# Altium footprint library Connector_PinHeader_1.27mm.PcbLib: 278 footprints (part 14 of 18) (continued)
## PinHeader_2x20_P1.27mm_Horizontal [mm] (continued)
F.CrtYd:
  lines w0.05: -1.15,-25.3 -1.15,1.15 7.3,1.15 7.3,-25.3 -1.15,-25.3
F.Fab:
  lines w0.1: 1.77,-24.33 -0.2,-24.33 -0.2,-23.93 1.77,-23.93 ; 1.77,-23.06 -0.2,-23.06 -0.2,-22.66 1.77,-22.66 ; 1.77,-21.79 -0.2,-21.79 -0.2,-21.39 1.77,-21.39 ; 1.77,-20.52 -0.2,-20.52 -0.2,-20.12 1.77,-20.12 ; 1.77,-19.25 -0.2,-19.25 -0.2,-18.85 1.77,-18.85 ; 1.77,-17.98 -0.2,-17.98 -0.2,-17.58 1.77,-17.58 ; 1.77,-16.71 -0.2,-16.71 -0.2,-16.31 1.77,-16.31 ; 1.77,-15.44 -0.2,-15.44 -0.2,-15.04 1.77,-15.04 ; 1.77,-14.17 -0.2,-14.17 -0.2,-13.77 1.77,-13.77 ; 1.77,-12.9 -0.2,-12.9 -0.2,-12.5 1.77,-12.5 ; 1.77,-11.63 -0.2,-11.63 -0.2,-11.23 1.77,-11.23 ; 1.77,-10.36 -0.2,-10.36 -0.2,-9.96 1.77,-9.96 ; 1.77,-9.09 -0.2,-9.09 -0.2,-8.69 1.77,-8.69 ; 1.77,-7.82 -0.2,-7.82 -0.2,-7.42 1.77,-7.42 ; 1.77,-6.55 -0.2,-6.55 -0.2,-6.15 1.77,-6.15 ; 1.77,-5.28 -0.2,-5.28 -0.2,-4.88 1.77,-4.88 ; 1.77,-4.01 -0.2,-4.01 -0.2,-3.61 1.77,-3.61 ; 1.77,-2.74 -0.2,-2.74 -0.2,-2.34 1.77,-2.34 ; 1.77,-1.47 -0.2,-1.47 -0.2,-1.07 1.77,-1.07 ; 1.77,-0.2 -0.2,-0.2 -0.2,0.2 1.77,0.2 ; 2.77,-24.33 6.77,-24.33 6.77,-23.93 2.77,-23.93 ; 2.77,-23.06 6.77,-23.06 6.77,-22.66 2.77,-22.66 ; 2.77,-21.79 6.77,-21.79 6.77,-21.39 2.77,-21.39 ; 2.77,-20.52 6.77,-20.52 6.77,-20.12 2.77,-20.12 ; 2.77,-19.25 6.77,-19.25 6.77,-18.85 2.77,-18.85 ; 2.77,-17.98 6.77,-17.98 6.77,-17.58 2.77,-17.58 ; 2.77,-16.71 6.77,-16.71 6.77,-16.31 2.77,-16.31 ; 2.77,-15.44 6.77,-15.44 6.77,-15.04 2.77,-15.04 ; 2.77,-14.17 6.77,-14.17 6.77,-13.77 2.77,-13.77 ; 2.77,-12.9 6.77,-12.9 6.77,-12.5 2.77,-12.5 ; 2.77,-11.63 6.77,-11.63 6.77,-11.23 2.77,-11.23 ; 2.77,-10.36 6.77,-10.36 6.77,-9.96 2.77,-9.96 ; 2.77,-9.09 6.77,-9.09 6.77,-8.69 2.77,-8.69 ; 2.77,-7.82 6.77,-7.82 6.77,-7.42 2.77,-7.42 ; 2.77,-6.55 6.77,-6.55 6.77,-6.15 2.77,-6.15 ; 2.77,-5.28 6.77,-5.28 6.77,-4.88 2.77,-4.88 ; 2.77,-4.01 6.77,-4.01 6.77,-3.61 2.77,-3.61 ; 2.77,-2.74 6.77,-2.74 6.77,-2.34 2.77,-2.34 ; 2.77,-1.47 6.77,-1.47 6.77,-1.07 2.77,-1.07 ; 2.77,-0.2 6.77,-0.2 6.77,0.2 2.77,0.2 ; 1.77,-24.765 2.77,-24.765 2.77,0.635 2.02,0.635 1.77,0.385 1.77,-24.765
  text "'.Designator'" at 2.774,-14.493 h0.6

## PinHeader_2x20_P1.27mm_Vertical [mm]
pads (40):
  rect 1x1 hole 0.65: 1(0,0)
  rrect100% 1x1 hole 0.65: 2(1.27,0) 3(0,-1.27) 4(1.27,-1.27) 5(0,-2.54) 6(1.27,-2.54) 7(0,-3.81) 8(1.27,-3.81) 9(0,-5.08) 10(1.27,-5.08) 11(0,-6.35) 12(1.27,-6.35) 13(0,-7.62) 14(1.27,-7.62) 15(0,-8.89) 16(1.27,-8.89) 17(0,-10.16) 18(1.27,-10.16) 19(0,-11.43) 20(1.27,-11.43) 21(0,-12.7) 22(1.27,-12.7) 23(0,-13.97) 24(1.27,-13.97) 25(0,-15.24) 26(1.27,-15.24) 27(0,-16.51) 28(1.27,-16.51) 29(0,-17.78) 30(1.27,-17.78) 31(0,-19.05) 32(1.27,-19.05) 33(0,-20.32) 34(1.27,-20.32) 35(0,-21.59) 36(1.27,-21.59) 37(0,-22.86) 38(1.27,-22.86) 39(0,-24.13) 40(1.27,-24.13)
F.SilkS:
  lines w0.12: -1.13,0 -1.13,0.76 0,0.76 ; -0.563,-0.76 -1.13,-0.76 -1.13,-24.825 -0.308,-24.825 ; 0.308,-24.825 0.962,-24.825 ; 0.563,-0.76 0.707,-0.76 ; 0.76,-0.707 0.76,-0.563 ; 0.76,0.563 0.76,0.695 0.962,0.695 ; 1.578,-24.825 2.4,-24.825 2.4,0.695 1.578,0.695
F.CrtYd:
  lines w0.05: -1.6,-25.3 2.85,-25.3 2.85,1.15 -1.6,1.15 -1.6,-25.3
F.Fab:
  lines w0.1: -1.07,-24.765 -1.07,-0.218 -0.218,0.635 2.34,0.635 2.34,-24.765 -1.07,-24.765
  text "'.Designator'" at 1.475,-16.112 h1

## PinHeader_2x20_P1.27mm_Vertical_SMD [mm]
pads (40):
  rect 2.4x0.74 smd: 1(-1.95,12.065) 2(1.95,12.065) 3(-1.95,10.795) 4(1.95,10.795) 5(-1.95,9.525) 6(1.95,9.525) 7(-1.95,8.255) 8(1.95,8.255) 9(-1.95,6.985) 10(1.95,6.985) 11(-1.95,5.715) 12(1.95,5.715) 13(-1.95,4.445) 14(1.95,4.445) 15(-1.95,3.175) 16(1.95,3.175) 17(-1.95,1.905) 18(1.95,1.905) 19(-1.95,0.635) 20(1.95,0.635) 21(-1.95,-0.635) 22(1.95,-0.635) 23(-1.95,-1.905) 24(1.95,-1.905) 25(-1.95,-3.175) 26(1.95,-3.175) 27(-1.95,-4.445) 28(1.95,-4.445) 29(-1.95,-5.715) 30(1.95,-5.715) 31(-1.95,-6.985) 32(1.95,-6.985) 33(-1.95,-8.255) 34(1.95,-8.255) 35(-1.95,-9.525) 36(1.95,-9.525) 37(-1.95,-10.795) 38(1.95,-10.795) 39(-1.95,-12.065) 40(1.95,-12.065)
F.SilkS:
  lines w0.12: -3.09,12.695 -1.765,12.695 -1.765,12.76 1.765,12.76 1.765,12.695 ; -1.765,-12.695 -1.765,-12.76 1.765,-12.76 1.765,-12.695
F.CrtYd:
  lines w0.05: -4.3,-13.2 -4.3,13.2 4.3,13.2 4.3,-13.2 -4.3,-13.2
F.Fab:
  lines w0.1: -1.705,-12.265 -2.75,-12.265 -2.75,-11.865 -1.705,-11.865 ; -1.705,-10.995 -2.75,-10.995 -2.75,-10.595 -1.705,-10.595 ; -1.705,-9.725 -2.75,-9.725 -2.75,-9.325 -1.705,-9.325 ; -1.705,-8.455 -2.75,-8.455 -2.75,-8.055 -1.705,-8.055 ; -1.705,-7.185 -2.75,-7.185 -2.75,-6.785 -1.705,-6.785 ; -1.705,-5.915 -2.75,-5.915 -2.75,-5.515 -1.705,-5.515 ; -1.705,-4.645 -2.75,-4.645 -2.75,-4.245 -1.705,-4.245 ; -1.705,-3.375 -2.75,-3.375 -2.75,-2.975 -1.705,-2.975 ; -1.705,-2.105 -2.75,-2.105 -2.75,-1.705 -1.705,-1.705 ; -1.705,-0.835 -2.75,-0.835 -2.75,-0.435 -1.705,-0.435 ; -1.705,0.435 -2.75,0.435 -2.75,0.835 -1.705,0.835 ; -1.705,1.705 -2.75,1.705 -2.75,2.105 -1.705,2.105 ; -1.705,2.975 -2.75,2.975 -2.75,3.375 -1.705,3.375 ; -1.705,4.245 -2.75,4.245 -2.75,4.645 -1.705,4.645 ; -1.705,5.515 -2.75,5.515 -2.75,5.915 -1.705,5.915 ; -1.705,6.785 -2.75,6.785 -2.75,7.185 -1.705,7.185 ; -1.705,8.055 -2.75,8.055 -2.75,8.455 -1.705,8.455 ; -1.705,9.325 -2.75,9.325 -2.75,9.725 -1.705,9.725 ; -1.705,10.595 -2.75,10.595 -2.75,10.995 -1.705,10.995 ; -1.705,11.865 -2.75,11.865 -2.75,12.265 -1.705,12.265 ; 1.705,-12.265 2.75,-12.265 2.75,-11.865 1.705,-11.865 ; 1.705,-10.995 2.75,-10.995 2.75,-10.595 1.705,-10.595 ; 1.705,-9.725 2.75,-9.725 2.75,-9.325 1.705,-9.325 ; 1.705,-8.455 2.75,-8.455 2.75,-8.055 1.705,-8.055 ; 1.705,-7.185 2.75,-7.185 2.75,-6.785 1.705,-6.785 ; 1.705,-5.915 2.75,-5.915 2.75,-5.515 1.705,-5.515 ; 1.705,-4.645 2.75,-4.645 2.75,-4.245 1.705,-4.245 ; 1.705,-3.375 2.75,-3.375 2.75,-2.975 1.705,-2.975 ; 1.705,-2.105 2.75,-2.105 2.75,-1.705 1.705,-1.705 ; 1.705,-0.835 2.75,-0.835 2.75,-0.435 1.705,-0.435 ; 1.705,0.435 2.75,0.435 2.75,0.835 1.705,0.835 ; 1.705,1.705 2.75,1.705 2.75,2.105 1.705,2.105 ; 1.705,2.975 2.75,2.975 2.75,3.375 1.705,3.375 ; 1.705,4.245 2.75,4.245 2.75,4.645 1.705,4.645 ; 1.705,5.515 2.75,5.515 2.75,5.915 1.705,5.915 ; 1.705,6.785 2.75,6.785 2.75,7.185 1.705,7.185 ; 1.705,8.055 2.75,8.055 2.75,8.455 1.705,8.455 ; 1.705,9.325 2.75,9.325 2.75,9.725 1.705,9.725 ; 1.705,10.595 2.75,10.595 2.75,10.995 1.705,10.995 ; 1.705,11.865 2.75,11.865 2.75,12.265 1.705,12.265 ; -1.705,12.265 -1.27,12.7 1.705,12.7 1.705,-12.7 -1.705,-12.7 -1.705,12.265
  text "'.Designator'" at 0.84,-4.047 h1

## PinHeader_2x21_P1.27mm_Horizontal [mm]
pads (42):
  rect 1x1 hole 0.65: 1(0,0)
  rrect100% 1x1 hole 0.65: 2(1.27,0) 3(0,-1.27) 4(1.27,-1.27) 5(0,-2.54) 6(1.27,-2.54) 7(0,-3.81) 8(1.27,-3.81) 9(0,-5.08) 10(1.27,-5.08) 11(0,-6.35) 12(1.27,-6.35) 13(0,-7.62) 14(1.27,-7.62) 15(0,-8.89) 16(1.27,-8.89) 17(0,-10.16) 18(1.27,-10.16) 19(0,-11.43) 20(1.27,-11.43) 21(0,-12.7) 22(1.27,-12.7) 23(0,-13.97) 24(1.27,-13.97) 25(0,-15.24) 26(1.27,-15.24) 27(0,-16.51) 28(1.27,-16.51) 29(0,-17.78) 30(1.27,-17.78) 31(0,-19.05) 32(1.27,-19.05) 33(0,-20.32) 34(1.27,-20.32) 35(0,-21.59) 36(1.27,-21.59) 37(0,-22.86) 38(1.27,-22.86) 39(0,-24.13) 40(1.27,-24.13) 41(0,-25.4) 42(1.27,-25.4)
F.SilkS:
  lines w0.12: -0.76,0 -0.76,0.76 0,0.76 ; 1.71,-26.02 1.71,-26.095 2.83,-26.095 2.83,0.695 1.71,0.695 1.71,0.62 ; 1.71,-24.78 1.71,-24.75 ; 1.71,-24.765 2.83,-24.765 ; 1.71,-23.51 1.71,-23.48 ; 1.71,-23.495 2.83,-23.495 ; 1.71,-22.24 1.71,-22.21 ; 1.71,-22.225 2.83,-22.225 ; 1.71,-20.97 1.71,-20.94 ; 1.71,-20.955 2.83,-20.955 ; 1.71,-19.7 1.71,-19.67 ; 1.71,-19.685 2.83,-19.685 ; 1.71,-18.43 1.71,-18.4 ; 1.71,-18.415 2.83,-18.415 ; 1.71,-17.16 1.71,-17.13 ; 1.71,-17.145 2.83,-17.145 ; 1.71,-15.89 1.71,-15.86 ; 1.71,-15.875 2.83,-15.875 ; 1.71,-14.62 1.71,-14.59 ; 1.71,-14.605 2.83,-14.605 ; 1.71,-13.35 1.71,-13.32 ; 1.71,-13.335 2.83,-13.335 ; 1.71,-12.08 1.71,-12.05 ; 1.71,-12.065 2.83,-12.065 ; 1.71,-10.81 1.71,-10.78 ; 1.71,-10.795 2.83,-10.795 ; 1.71,-9.54 1.71,-9.51 ; 1.71,-9.525 2.83,-9.525 ; 1.71,-8.27 1.71,-8.24 ; 1.71,-8.255 2.83,-8.255 ; 1.71,-7 1.71,-6.97 ; 1.71,-6.985 2.83,-6.985 ; 1.71,-5.73 1.71,-5.7 ; 1.71,-5.715 2.83,-5.715 ; 1.71,-4.46 1.71,-4.43 ; 1.71,-4.445 2.83,-4.445 ; 1.71,-3.19 1.71,-3.16 ; 1.71,-3.175 2.83,-3.175 ; 1.71,-1.92 1.71,-1.89 ; 1.71,-1.905 2.83,-1.905 ; 1.71,-0.65 1.71,-0.62 ; 1.71,-0.635 2.83,-0.635 ; 2.83,-25.66 6.83,-25.66 6.83,-25.14 2.83,-25.14 ; 2.83,-24.39 6.83,-24.39 6.83,-23.87 2.83,-23.87 ; 2.83,-23.12 6.83,-23.12 6.83,-22.6 2.83,-22.6 ; 2.83,-21.85 6.83,-21.85 6.83,-21.33 2.83,-21.33 ; 2.83,-20.58 6.83,-20.58 6.83,-20.06 2.83,-20.06 ; 2.83,-19.31 6.83,-19.31 6.83,-18.79 2.83,-18.79 ; 2.83,-18.04 6.83,-18.04 6.83,-17.52 2.83,-17.52 ; 2.83,-16.77 6.83,-16.77 6.83,-16.25 2.83,-16.25 ; 2.83,-15.5 6.83,-15.5 6.83,-14.98 2.83,-14.98 ; 2.83,-14.23 6.83,-14.23 6.83,-13.71 2.83,-13.71 ; 2.83,-12.96 6.83,-12.96 6.83,-12.44 2.83,-12.44 ; 2.83,-11.69 6.83,-11.69 6.83,-11.17 2.83,-11.17 ; 2.83,-10.42 6.83,-10.42 6.83,-9.9 2.83,-9.9 ; 2.83,-9.15 6.83,-9.15 6.83,-8.63 2.83,-8.63 ; 2.83,-7.88 6.83,-7.88 6.83,-7.36 2.83,-7.36 ; 2.83,-6.61 6.83,-6.61 6.83,-6.09 2.83,-6.09 ; 2.83,-5.34 6.83,-5.34 6.83,-4.82 2.83,-4.82 ; 2.83,-4.07 6.83,-4.07 6.83,-3.55 2.83,-3.55 ; 2.83,-2.8 6.83,-2.8 6.83,-2.28 2.83,-2.28 ; 2.83,-1.53 6.83,-1.53 6.83,-1.01 2.83,-1.01 ; 2.83,-0.26 6.83,-0.26 6.83,0.26 2.83,0.26 ; 2.83,-0.16 6.83,-0.16 ; 2.83,-0.04 6.83,-0.04 ; 2.83,0.08 6.83,0.08 ; 2.83,0.2 6.83,0.2
F.CrtYd:
  lines w0.05: -1.15,-26.55 7.3,-26.55 7.3,1.15 -1.15,1.15 -1.15,-26.55
F.Fab:
  lines w0.1: 1.77,-25.6 -0.2,-25.6 -0.2,-25.2 1.77,-25.2 ; 1.77,-24.33 -0.2,-24.33 -0.2,-23.93 1.77,-23.93 ; 1.77,-23.06 -0.2,-23.06 -0.2,-22.66 1.77,-22.66 ; 1.77,-21.79 -0.2,-21.79 -0.2,-21.39 1.77,-21.39 ; 1.77,-20.52 -0.2,-20.52 -0.2,-20.12 1.77,-20.12 ; 1.77,-19.25 -0.2,-19.25 -0.2,-18.85 1.77,-18.85 ; 1.77,-17.98 -0.2,-17.98 -0.2,-17.58 1.77,-17.58 ; 1.77,-16.71 -0.2,-16.71 -0.2,-16.31 1.77,-16.31 ; 1.77,-15.44 -0.2,-15.44 -0.2,-15.04 1.77,-15.04 ; 1.77,-14.17 -0.2,-14.17 -0.2,-13.77 1.77,-13.77 ; 1.77,-12.9 -0.2,-12.9 -0.2,-12.5 1.77,-12.5 ; 1.77,-11.63 -0.2,-11.63 -0.2,-11.23 1.77,-11.23 ; 1.77,-10.36 -0.2,-10.36 -0.2,-9.96 1.77,-9.96 ; 1.77,-9.09 -0.2,-9.09 -0.2,-8.69 1.77,-8.69 ; 1.77,-7.82 -0.2,-7.82 -0.2,-7.42 1.77,-7.42 ; 1.77,-6.55 -0.2,-6.55 -0.2,-6.15 1.77,-6.15 ; 1.77,-5.28 -0.2,-5.28 -0.2,-4.88 1.77,-4.88 ; 1.77,-4.01 -0.2,-4.01 -0.2,-3.61 1.77,-3.61 ; 1.77,-2.74 -0.2,-2.74 -0.2,-2.34 1.77,-2.34 ; 1.77,-1.47 -0.2,-1.47 -0.2,-1.07 1.77,-1.07 ; 1.77,-0.2 -0.2,-0.2 -0.2,0.2 1.77,0.2 ; 2.77,-25.6 6.77,-25.6 6.77,-25.2 2.77,-25.2 ; 2.77,-24.33 6.77,-24.33 6.77,-23.93 2.77,-23.93 ; 2.77,-23.06 6.77,-23.06 6.77,-22.66 2.77,-22.66 ; 2.77,-21.79 6.77,-21.79 6.77,-21.39 2.77,-21.39 ; 2.77,-20.52 6.77,-20.52 6.77,-20.12 2.77,-20.12 ; 2.77,-19.25 6.77,-19.25 6.77,-18.85 2.77,-18.85 ; 2.77,-17.98 6.77,-17.98 6.77,-17.58 2.77,-17.58 ; 2.77,-16.71 6.77,-16.71 6.77,-16.31 2.77,-16.31 ; 2.77,-15.44 6.77,-15.44 6.77,-15.04 2.77,-15.04 ; 2.77,-14.17 6.77,-14.17 6.77,-13.77 2.77,-13.77 ; 2.77,-12.9 6.77,-12.9 6.77,-12.5 2.77,-12.5 ; 2.77,-11.63 6.77,-11.63 6.77,-11.23 2.77,-11.23 ; 2.77,-10.36 6.77,-10.36 6.77,-9.96 2.77,-9.96 ; 2.77,-9.09 6.77,-9.09 6.77,-8.69 2.77,-8.69 ; 2.77,-7.82 6.77,-7.82 6.77,-7.42 2.77,-7.42 ; 2.77,-6.55 6.77,-6.55 6.77,-6.15 2.77,-6.15 ; 2.77,-5.28 6.77,-5.28 6.77,-4.88 2.77,-4.88 ; 2.77,-4.01 6.77,-4.01 6.77,-3.61 2.77,-3.61 ; 2.77,-2.74 6.77,-2.74 6.77,-2.34 2.77,-2.34 ; 2.77,-1.47 6.77,-1.47 6.77,-1.07 2.77,-1.07 ; 2.77,-0.2 6.77,-0.2 6.77,0.2 2.77,0.2 ; 1.77,-26.035 2.77,-26.035 2.77,0.635 2.02,0.635 1.77,0.385 1.77,-26.035
  text "'.Designator'" at 2.774,-15.128 h0.6

## PinHeader_2x21_P1.27mm_Vertical [mm]
pads (42):
  rect 1x1 hole 0.65: 1(0,0)
  rrect100% 1x1 hole 0.65: 2(1.27,0) 3(0,-1.27) 4(1.27,-1.27) 5(0,-2.54) 6(1.27,-2.54) 7(0,-3.81) 8(1.27,-3.81) 9(0,-5.08) 10(1.27,-5.08) 11(0,-6.35) 12(1.27,-6.35) 13(0,-7.62) 14(1.27,-7.62) 15(0,-8.89) 16(1.27,-8.89) 17(0,-10.16) 18(1.27,-10.16) 19(0,-11.43) 20(1.27,-11.43) 21(0,-12.7) 22(1.27,-12.7) 23(0,-13.97) 24(1.27,-13.97) 25(0,-15.24) 26(1.27,-15.24) 27(0,-16.51) 28(1.27,-16.51) 29(0,-17.78) 30(1.27,-17.78) 31(0,-19.05) 32(1.27,-19.05) 33(0,-20.32) 34(1.27,-20.32) 35(0,-21.59) 36(1.27,-21.59) 37(0,-22.86) 38(1.27,-22.86) 39(0,-24.13) 40(1.27,-24.13) 41(0,-25.4) 42(1.27,-25.4)
F.SilkS:
  lines w0.12: -1.13,0 -1.13,0.76 0,0.76 ; -0.563,-0.76 -1.13,-0.76 -1.13,-26.095 -0.308,-26.095 ; 0.308,-26.095 0.962,-26.095 ; 0.563,-0.76 0.707,-0.76 ; 0.76,-0.707 0.76,-0.563 ; 0.76,0.563 0.76,0.695 0.962,0.695 ; 1.578,-26.095 2.4,-26.095 2.4,0.695 1.578,0.695
F.CrtYd:
  lines w0.05: -1.6,-26.55 -1.6,1.15 2.85,1.15 2.85,-26.55 -1.6,-26.55
F.Fab:
  lines w0.1: -1.07,-26.035 2.34,-26.035 2.34,0.635 -0.218,0.635 -1.07,-0.218 -1.07,-26.035
  text "'.Designator'" at 1.475,-16.747 h1

## PinHeader_2x21_P1.27mm_Vertical_SMD [mm]
pads (42):
  rect 2.4x0.74 smd: 1(-1.95,12.7) 2(1.95,12.7) 3(-1.95,11.43) 4(1.95,11.43) 5(-1.95,10.16) 6(1.95,10.16) 7(-1.95,8.89) 8(1.95,8.89) 9(-1.95,7.62) 10(1.95,7.62) 11(-1.95,6.35) 12(1.95,6.35) 13(-1.95,5.08) 14(1.95,5.08) 15(-1.95,3.81) 16(1.95,3.81) 17(-1.95,2.54) 18(1.95,2.54) 19(-1.95,1.27) 20(1.95,1.27) 21(-1.95,0) 22(1.95,0) 23(-1.95,-1.27) 24(1.95,-1.27) 25(-1.95,-2.54) 26(1.95,-2.54) 27(-1.95,-3.81) 28(1.95,-3.81) 29(-1.95,-5.08) 30(1.95,-5.08) 31(-1.95,-6.35) 32(1.95,-6.35) 33(-1.95,-7.62) 34(1.95,-7.62) 35(-1.95,-8.89) 36(1.95,-8.89) 37(-1.95,-10.16) 38(1.95,-10.16) 39(-1.95,-11.43) 40(1.95,-11.43) 41(-1.95,-12.7) 42(1.95,-12.7)
F.SilkS:
  lines w0.12: -3.09,13.33 -1.765,13.33 -1.765,13.395 1.765,13.395 1.765,13.33 ; -1.765,-13.33 -1.765,-13.395 1.765,-13.395 1.765,-13.33
F.CrtYd:
  lines w0.05: -4.3,-13.85 -4.3,13.85 4.3,13.85 4.3,-13.85 -4.3,-13.85
F.Fab:
  lines w0.1: -1.705,-12.9 -2.75,-12.9 -2.75,-12.5 -1.705,-12.5 ; -1.705,-11.63 -2.75,-11.63 -2.75,-11.23 -1.705,-11.23 ; -1.705,-10.36 -2.75,-10.36 -2.75,-9.96 -1.705,-9.96 ; -1.705,-9.09 -2.75,-9.09 -2.75,-8.69 -1.705,-8.69 ; -1.705,-7.82 -2.75,-7.82 -2.75,-7.42 -1.705,-7.42 ; -1.705,-6.55 -2.75,-6.55 -2.75,-6.15 -1.705,-6.15 ; -1.705,-5.28 -2.75,-5.28 -2.75,-4.88 -1.705,-4.88 ; -1.705,-4.01 -2.75,-4.01 -2.75,-3.61 -1.705,-3.61 ; -1.705,-2.74 -2.75,-2.74 -2.75,-2.34 -1.705,-2.34 ; -1.705,-1.47 -2.75,-1.47 -2.75,-1.07 -1.705,-1.07 ; -1.705,-0.2 -2.75,-0.2 -2.75,0.2 -1.705,0.2 ; -1.705,1.07 -2.75,1.07 -2.75,1.47 -1.705,1.47 ; -1.705,2.34 -2.75,2.34 -2.75,2.74 -1.705,2.74 ; -1.705,3.61 -2.75,3.61 -2.75,4.01 -1.705,4.01 ; -1.705,4.88 -2.75,4.88 -2.75,5.28 -1.705,5.28 ; -1.705,6.15 -2.75,6.15 -2.75,6.55 -1.705,6.55 ; -1.705,7.42 -2.75,7.42 -2.75,7.82 -1.705,7.82 ; -1.705,8.69 -2.75,8.69 -2.75,9.09 -1.705,9.09 ; -1.705,9.96 -2.75,9.96 -2.75,10.36 -1.705,10.36 ; -1.705,11.23 -2.75,11.23 -2.75,11.63 -1.705,11.63 ; -1.705,12.5 -2.75,12.5 -2.75,12.9 -1.705,12.9 ; 1.705,-12.9 2.75,-12.9 2.75,-12.5 1.705,-12.5 ; 1.705,-11.63 2.75,-11.63 2.75,-11.23 1.705,-11.23 ; 1.705,-10.36 2.75,-10.36 2.75,-9.96 1.705,-9.96 ; 1.705,-9.09 2.75,-9.09 2.75,-8.69 1.705,-8.69 ; 1.705,-7.82 2.75,-7.82 2.75,-7.42 1.705,-7.42 ; 1.705,-6.55 2.75,-6.55 2.75,-6.15 1.705,-6.15 ; 1.705,-5.28 2.75,-5.28 2.75,-4.88 1.705,-4.88 ; 1.705,-4.01 2.75,-4.01 2.75,-3.61 1.705,-3.61 ; 1.705,-2.74 2.75,-2.74 2.75,-2.34 1.705,-2.34 ; 1.705,-1.47 2.75,-1.47 2.75,-1.07 1.705,-1.07 ; 1.705,-0.2 2.75,-0.2 2.75,0.2 1.705,0.2 ; 1.705,1.07 2.75,1.07 2.75,1.47 1.705,1.47 ; 1.705,2.34 2.75,2.34 2.75,2.74 1.705,2.74 ; 1.705,3.61 2.75,3.61 2.75,4.01 1.705,4.01 ; 1.705,4.88 2.75,4.88 2.75,5.28 1.705,5.28 ; 1.705,6.15 2.75,6.15 2.75,6.55 1.705,6.55 ; 1.705,7.42 2.75,7.42 2.75,7.82 1.705,7.82 ; 1.705,8.69 2.75,8.69 2.75,9.09 1.705,9.09 ; 1.705,9.96 2.75,9.96 2.75,10.36 1.705,10.36 ; 1.705,11.23 2.75,11.23 2.75,11.63 1.705,11.63 ; 1.705,12.5 2.75,12.5 2.75,12.9 1.705,12.9 ; -1.705,12.9 -1.27,13.335 1.705,13.335 1.705,-13.335 -1.705,-13.335 -1.705,12.9
  text "'.Designator'" at 0.84,-4.047 h1

## PinHeader_2x22_P1.27mm_Horizontal [mm]
pads (44):
  rect 1x1 hole 0.65: 1(0,0)
  rrect100% 1x1 hole 0.65: 2(1.27,0) 3(0,-1.27) 4(1.27,-1.27) 5(0,-2.54) 6(1.27,-2.54) 7(0,-3.81) 8(1.27,-3.81) 9(0,-5.08) 10(1.27,-5.08) 11(0,-6.35) 12(1.27,-6.35) 13(0,-7.62) 14(1.27,-7.62) 15(0,-8.89) 16(1.27,-8.89) 17(0,-10.16) 18(1.27,-10.16) 19(0,-11.43) 20(1.27,-11.43) 21(0,-12.7) 22(1.27,-12.7) 23(0,-13.97) 24(1.27,-13.97) 25(0,-15.24) 26(1.27,-15.24) 27(0,-16.51) 28(1.27,-16.51) 29(0,-17.78) 30(1.27,-17.78) 31(0,-19.05) 32(1.27,-19.05) 33(0,-20.32) 34(1.27,-20.32) 35(0,-21.59) 36(1.27,-21.59) 37(0,-22.86) 38(1.27,-22.86) 39(0,-24.13) 40(1.27,-24.13) 41(0,-25.4) 42(1.27,-25.4) 43(0,-26.67) 44(1.27,-26.67)
F.SilkS:
  lines w0.12: -0.76,0 -0.76,0.76 0,0.76 ; 1.71,-27.29 1.71,-27.365 2.83,-27.365 2.83,0.695 1.71,0.695 1.71,0.62 ; 1.71,-26.05 1.71,-26.02 ; 1.71,-26.035 2.83,-26.035 ; 1.71,-24.78 1.71,-24.75 ; 1.71,-24.765 2.83,-24.765 ; 1.71,-23.51 1.71,-23.48 ; 1.71,-23.495 2.83,-23.495 ; 1.71,-22.24 1.71,-22.21 ; 1.71,-22.225 2.83,-22.225 ; 1.71,-20.97 1.71,-20.94 ; 1.71,-20.955 2.83,-20.955 ; 1.71,-19.7 1.71,-19.67 ; 1.71,-19.685 2.83,-19.685 ; 1.71,-18.43 1.71,-18.4 ; 1.71,-18.415 2.83,-18.415 ; 1.71,-17.16 1.71,-17.13 ; 1.71,-17.145 2.83,-17.145 ; 1.71,-15.89 1.71,-15.86 ; 1.71,-15.875 2.83,-15.875 ; 1.71,-14.62 1.71,-14.59 ; 1.71,-14.605 2.83,-14.605 ; 1.71,-13.35 1.71,-13.32 ; 1.71,-13.335 2.83,-13.335 ; 1.71,-12.08 1.71,-12.05 ; 1.71,-12.065 2.83,-12.065 ; 1.71,-10.81 1.71,-10.78 ; 1.71,-10.795 2.83,-10.795 ; 1.71,-9.54 1.71,-9.51 ; 1.71,-9.525 2.83,-9.525 ; 1.71,-8.27 1.71,-8.24 ; 1.71,-8.255 2.83,-8.255 ; 1.71,-7 1.71,-6.97 ; 1.71,-6.985 2.83,-6.985 ; 1.71,-5.73 1.71,-5.7 ; 1.71,-5.715 2.83,-5.715 ; 1.71,-4.46 1.71,-4.43 ; 1.71,-4.445 2.83,-4.445 ; 1.71,-3.19 1.71,-3.16 ; 1.71,-3.175 2.83,-3.175 ; 1.71,-1.92 1.71,-1.89 ; 1.71,-1.905 2.83,-1.905 ; 1.71,-0.65 1.71,-0.62 ; 1.71,-0.635 2.83,-0.635 ; 2.83,-26.93 6.83,-26.93 6.83,-26.41 2.83,-26.41 ; 2.83,-25.66 6.83,-25.66 6.83,-25.14 2.83,-25.14 ; 2.83,-24.39 6.83,-24.39 6.83,-23.87 2.83,-23.87 ; 2.83,-23.12 6.83,-23.12 6.83,-22.6 2.83,-22.6 ; 2.83,-21.85 6.83,-21.85 6.83,-21.33 2.83,-21.33 ; 2.83,-20.58 6.83,-20.58 6.83,-20.06 2.83,-20.06 ; 2.83,-19.31 6.83,-19.31 6.83,-18.79 2.83,-18.79 ; 2.83,-18.04 6.83,-18.04 6.83,-17.52 2.83,-17.52 ; 2.83,-16.77 6.83,-16.77 6.83,-16.25 2.83,-16.25 ; 2.83,-15.5 6.83,-15.5 6.83,-14.98 2.83,-14.98 ; 2.83,-14.23 6.83,-14.23 6.83,-13.71 2.83,-13.71 ; 2.83,-12.96 6.83,-12.96 6.83,-12.44 2.83,-12.44 ; 2.83,-11.69 6.83,-11.69 6.83,-11.17 2.83,-11.17 ; 2.83,-10.42 6.83,-10.42 6.83,-9.9 2.83,-9.9 ; 2.83,-9.15 6.83,-9.15 6.83,-8.63 2.83,-8.63 ; 2.83,-7.88 6.83,-7.88 6.83,-7.36 2.83,-7.36 ; 2.83,-6.61 6.83,-6.61 6.83,-6.09 2.83,-6.09 ; 2.83,-5.34 6.83,-5.34 6.83,-4.82 2.83,-4.82 ; 2.83,-4.07 6.83,-4.07 6.83,-3.55 2.83,-3.55 ; 2.83,-2.8 6.83,-2.8 6.83,-2.28 2.83,-2.28 ; 2.83,-1.53 6.83,-1.53 6.83,-1.01 2.83,-1.01 ; 2.83,-0.26 6.83,-0.26 6.83,0.26 2.83,0.26 ; 2.83,-0.16 6.83,-0.16 ; 2.83,-0.04 6.83,-0.04 ; 2.83,0.08 6.83,0.08 ; 2.83,0.2 6.83,0.2
F.CrtYd:
  lines w0.05: -1.15,-27.85 -1.15,1.15 7.3,1.15 7.3,-27.85 -1.15,-27.85
F.Fab:
  lines w0.1: 1.77,-26.87 -0.2,-26.87 -0.2,-26.47 1.77,-26.47 ; 1.77,-25.6 -0.2,-25.6 -0.2,-25.2 1.77,-25.2 ; 1.77,-24.33 -0.2,-24.33 -0.2,-23.93 1.77,-23.93 ; 1.77,-23.06 -0.2,-23.06 -0.2,-22.66 1.77,-22.66 ; 1.77,-21.79 -0.2,-21.79 -0.2,-21.39 1.77,-21.39 ; 1.77,-20.52 -0.2,-20.52 -0.2,-20.12 1.77,-20.12 ; 1.77,-19.25 -0.2,-19.25 -0.2,-18.85 1.77,-18.85 ; 1.77,-17.98 -0.2,-17.98 -0.2,-17.58 1.77,-17.58 ; 1.77,-16.71 -0.2,-16.71 -0.2,-16.31 1.77,-16.31 ; 1.77,-15.44 -0.2,-15.44 -0.2,-15.04 1.77,-15.04 ; 1.77,-14.17 -0.2,-14.17 -0.2,-13.77 1.77,-13.77 ; 1.77,-12.9 -0.2,-12.9 -0.2,-12.5 1.77,-12.5 ; 1.77,-11.63 -0.2,-11.63 -0.2,-11.23 1.77,-11.23 ; 1.77,-10.36 -0.2,-10.36 -0.2,-9.96 1.77,-9.96 ; 1.77,-9.09 -0.2,-9.09 -0.2,-8.69 1.77,-8.69 ; 1.77,-7.82 -0.2,-7.82 -0.2,-7.42 1.77,-7.42 ; 1.77,-6.55 -0.2,-6.55 -0.2,-6.15 1.77,-6.15 ; 1.77,-5.28 -0.2,-5.28 -0.2,-4.88 1.77,-4.88 ; 1.77,-4.01 -0.2,-4.01 -0.2,-3.61 1.77,-3.61 ; 1.77,-2.74 -0.2,-2.74 -0.2,-2.34 1.77,-2.34 ; 1.77,-1.47 -0.2,-1.47 -0.2,-1.07 1.77,-1.07 ; 1.77,-0.2 -0.2,-0.2 -0.2,0.2 1.77,0.2 ; 2.77,-26.87 6.77,-26.87 6.77,-26.47 2.77,-26.47 ; 2.77,-25.6 6.77,-25.6 6.77,-25.2 2.77,-25.2 ; 2.77,-24.33 6.77,-24.33 6.77,-23.93 2.77,-23.93 ; 2.77,-23.06 6.77,-23.06 6.77,-22.66 2.77,-22.66 ; 2.77,-21.79 6.77,-21.79 6.77,-21.39 2.77,-21.39 ; 2.77,-20.52 6.77,-20.52 6.77,-20.12 2.77,-20.12 ; 2.77,-19.25 6.77,-19.25 6.77,-18.85 2.77,-18.85 ; 2.77,-17.98 6.77,-17.98 6.77,-17.58 2.77,-17.58 ; 2.77,-16.71 6.77,-16.71 6.77,-16.31 2.77,-16.31 ; 2.77,-15.44 6.77,-15.44 6.77,-15.04 2.77,-15.04 ; 2.77,-14.17 6.77,-14.17 6.77,-13.77 2.77,-13.77 ; 2.77,-12.9 6.77,-12.9 6.77,-12.5 2.77,-12.5 ; 2.77,-11.63 6.77,-11.63 6.77,-11.23 2.77,-11.23 ; 2.77,-10.36 6.77,-10.36 6.77,-9.96 2.77,-9.96 ; 2.77,-9.09 6.77,-9.09 6.77,-8.69 2.77,-8.69 ; 2.77,-7.82 6.77,-7.82 6.77,-7.42 2.77,-7.42 ; 2.77,-6.55 6.77,-6.55 6.77,-6.15 2.77,-6.15 ; 2.77,-5.28 6.77,-5.28 6.77,-4.88 2.77,-4.88 ; 2.77,-4.01 6.77,-4.01 6.77,-3.61 2.77,-3.61 ; 2.77,-2.74 6.77,-2.74 6.77,-2.34 2.77,-2.34 ; 2.77,-1.47 6.77,-1.47 6.77,-1.07 2.77,-1.07 ; 2.77,-0.2 6.77,-0.2 6.77,0.2 2.77,0.2 ; 1.77,-27.305 2.77,-27.305 2.77,0.635 2.02,0.635 1.77,0.385 1.77,-27.305
  text "'.Designator'" at 2.774,-15.763 h0.6

## PinHeader_2x22_P1.27mm_Vertical [mm]
pads (44):
  rect 1x1 hole 0.65: 1(0,0)
  rrect100% 1x1 hole 0.65: 2(1.27,0) 3(0,-1.27) 4(1.27,-1.27) 5(0,-2.54) 6(1.27,-2.54) 7(0,-3.81) 8(1.27,-3.81) 9(0,-5.08) 10(1.27,-5.08) 11(0,-6.35) 12(1.27,-6.35) 13(0,-7.62) 14(1.27,-7.62) 15(0,-8.89) 16(1.27,-8.89) 17(0,-10.16) 18(1.27,-10.16) 19(0,-11.43) 20(1.27,-11.43) 21(0,-12.7) 22(1.27,-12.7) 23(0,-13.97) 24(1.27,-13.97) 25(0,-15.24) 26(1.27,-15.24) 27(0,-16.51) 28(1.27,-16.51) 29(0,-17.78) 30(1.27,-17.78) 31(0,-19.05) 32(1.27,-19.05) 33(0,-20.32) 34(1.27,-20.32) 35(0,-21.59) 36(1.27,-21.59) 37(0,-22.86) 38(1.27,-22.86) 39(0,-24.13) 40(1.27,-24.13) 41(0,-25.4) 42(1.27,-25.4) 43(0,-26.67) 44(1.27,-26.67)
F.SilkS:
  lines w0.12: -1.13,0 -1.13,0.76 0,0.76 ; -0.563,-0.76 -1.13,-0.76 -1.13,-27.365 -0.308,-27.365 ; 0.308,-27.365 0.962,-27.365 ; 0.563,-0.76 0.707,-0.76 ; 0.76,-0.707 0.76,-0.563 ; 0.76,0.563 0.76,0.695 0.962,0.695 ; 1.578,-27.365 2.4,-27.365 2.4,0.695 1.578,0.695
F.CrtYd:
  lines w0.05: -1.6,-27.85 -1.6,1.15 2.85,1.15 2.85,-27.85 -1.6,-27.85
F.Fab:
  lines w0.1: -1.07,-27.305 2.34,-27.305 2.34,0.635 -0.218,0.635 -1.07,-0.218 -1.07,-27.305
  text "'.Designator'" at 1.475,-17.382 h1

## PinHeader_2x22_P1.27mm_Vertical_SMD [mm]
pads (44):
  rect 2.4x0.74 smd: 1(-1.95,13.335) 2(1.95,13.335) 3(-1.95,12.065) 4(1.95,12.065) 5(-1.95,10.795) 6(1.95,10.795) 7(-1.95,9.525) 8(1.95,9.525) 9(-1.95,8.255) 10(1.95,8.255) 11(-1.95,6.985) 12(1.95,6.985) 13(-1.95,5.715) 14(1.95,5.715) 15(-1.95,4.445) 16(1.95,4.445) 17(-1.95,3.175) 18(1.95,3.175) 19(-1.95,1.905) 20(1.95,1.905) 21(-1.95,0.635) 22(1.95,0.635) 23(-1.95,-0.635) 24(1.95,-0.635) 25(-1.95,-1.905) 26(1.95,-1.905) 27(-1.95,-3.175) 28(1.95,-3.175) 29(-1.95,-4.445) 30(1.95,-4.445) 31(-1.95,-5.715) 32(1.95,-5.715) 33(-1.95,-6.985) 34(1.95,-6.985) 35(-1.95,-8.255) 36(1.95,-8.255) 37(-1.95,-9.525) 38(1.95,-9.525) 39(-1.95,-10.795) 40(1.95,-10.795) 41(-1.95,-12.065) 42(1.95,-12.065) 43(-1.95,-13.335) 44(1.95,-13.335)
F.SilkS:
  lines w0.12: -3.09,13.965 -1.765,13.965 -1.765,14.03 1.765,14.03 1.765,13.965 ; -1.765,-13.965 -1.765,-14.03 1.765,-14.03 1.765,-13.965
F.CrtYd:
  lines w0.05: -4.3,-14.5 4.3,-14.5 4.3,14.5 -4.3,14.5 -4.3,-14.5
F.Fab:
  lines w0.1: -1.705,-13.535 -2.75,-13.535 -2.75,-13.135 -1.705,-13.135 ; -1.705,-12.265 -2.75,-12.265 -2.75,-11.865 -1.705,-11.865 ; -1.705,-10.995 -2.75,-10.995 -2.75,-10.595 -1.705,-10.595 ; -1.705,-9.725 -2.75,-9.725 -2.75,-9.325 -1.705,-9.325 ; -1.705,-8.455 -2.75,-8.455 -2.75,-8.055 -1.705,-8.055 ; -1.705,-7.185 -2.75,-7.185 -2.75,-6.785 -1.705,-6.785 ; -1.705,-5.915 -2.75,-5.915 -2.75,-5.515 -1.705,-5.515 ; -1.705,-4.645 -2.75,-4.645 -2.75,-4.245 -1.705,-4.245 ; -1.705,-3.375 -2.75,-3.375 -2.75,-2.975 -1.705,-2.975 ; -1.705,-2.105 -2.75,-2.105 -2.75,-1.705 -1.705,-1.705 ; -1.705,-0.835 -2.75,-0.835 -2.75,-0.435 -1.705,-0.435 ; -1.705,0.435 -2.75,0.435 -2.75,0.835 -1.705,0.835 ; -1.705,1.705 -2.75,1.705 -2.75,2.105 -1.705,2.105 ; -1.705,2.975 -2.75,2.975 -2.75,3.375 -1.705,3.375 ; -1.705,4.245 -2.75,4.245 -2.75,4.645 -1.705,4.645 ; -1.705,5.515 -2.75,5.515 -2.75,5.915 -1.705,5.915 ; -1.705,6.785 -2.75,6.785 -2.75,7.185 -1.705,7.185 ; -1.705,8.055 -2.75,8.055 -2.75,8.455 -1.705,8.455 ; -1.705,9.325 -2.75,9.325 -2.75,9.725 -1.705,9.725 ; -1.705,10.595 -2.75,10.595 -2.75,10.995 -1.705,10.995 ; -1.705,11.865 -2.75,11.865 -2.75,12.265 -1.705,12.265 ; -1.705,13.135 -2.75,13.135 -2.75,13.535 -1.705,13.535 ; 1.705,-13.535 2.75,-13.535 2.75,-13.135 1.705,-13.135 ; 1.705,-12.265 2.75,-12.265 2.75,-11.865 1.705,-11.865 ; 1.705,-10.995 2.75,-10.995 2.75,-10.595 1.705,-10.595 ; 1.705,-9.725 2.75,-9.725 2.75,-9.325 1.705,-9.325 ; 1.705,-8.455 2.75,-8.455 2.75,-8.055 1.705,-8.055 ; 1.705,-7.185 2.75,-7.185 2.75,-6.785 1.705,-6.785 ; 1.705,-5.915 2.75,-5.915 2.75,-5.515 1.705,-5.515 ; 1.705,-4.645 2.75,-4.645 2.75,-4.245 1.705,-4.245 ; 1.705,-3.375 2.75,-3.375 2.75,-2.975 1.705,-2.975 ; 1.705,-2.105 2.75,-2.105 2.75,-1.705 1.705,-1.705 ; 1.705,-0.835 2.75,-0.835 2.75,-0.435 1.705,-0.435 ; 1.705,0.435 2.75,0.435 2.75,0.835 1.705,0.835 ; 1.705,1.705 2.75,1.705 2.75,2.105 1.705,2.105 ; 1.705,2.975 2.75,2.975 2.75,3.375 1.705,3.375 ; 1.705,4.245 2.75,4.245 2.75,4.645 1.705,4.645 ; 1.705,5.515 2.75,5.515 2.75,5.915 1.705,5.915 ; 1.705,6.785 2.75,6.785 2.75,7.185 1.705,7.185 ; 1.705,8.055 2.75,8.055 2.75,8.455 1.705,8.455 ; 1.705,9.325 2.75,9.325 2.75,9.725 1.705,9.725 ; 1.705,10.595 2.75,10.595 2.75,10.995 1.705,10.995 ; 1.705,11.865 2.75,11.865 2.75,12.265 1.705,12.265 ; 1.705,13.135 2.75,13.135 2.75,13.535 1.705,13.535 ; -1.705,13.535 -1.27,13.97 1.705,13.97 1.705,-13.97 -1.705,-13.97 -1.705,13.535
  text "'.Designator'" at 0.84,-4.047 h1